# Altium footprint library 3D_MIG_Controller.PCBLIB: 560 footprints (part 23 of 35)
Each footprint in its own frame and in the unit in brackets; x right, y up, seen from the top. Pads: shape width x height; smd on the part's side, far side on the other; paste and mask are expansions set on the pad; w line width, h text height; cw(c..) or ccw(c..) is an arc to the next point about the centre after c.
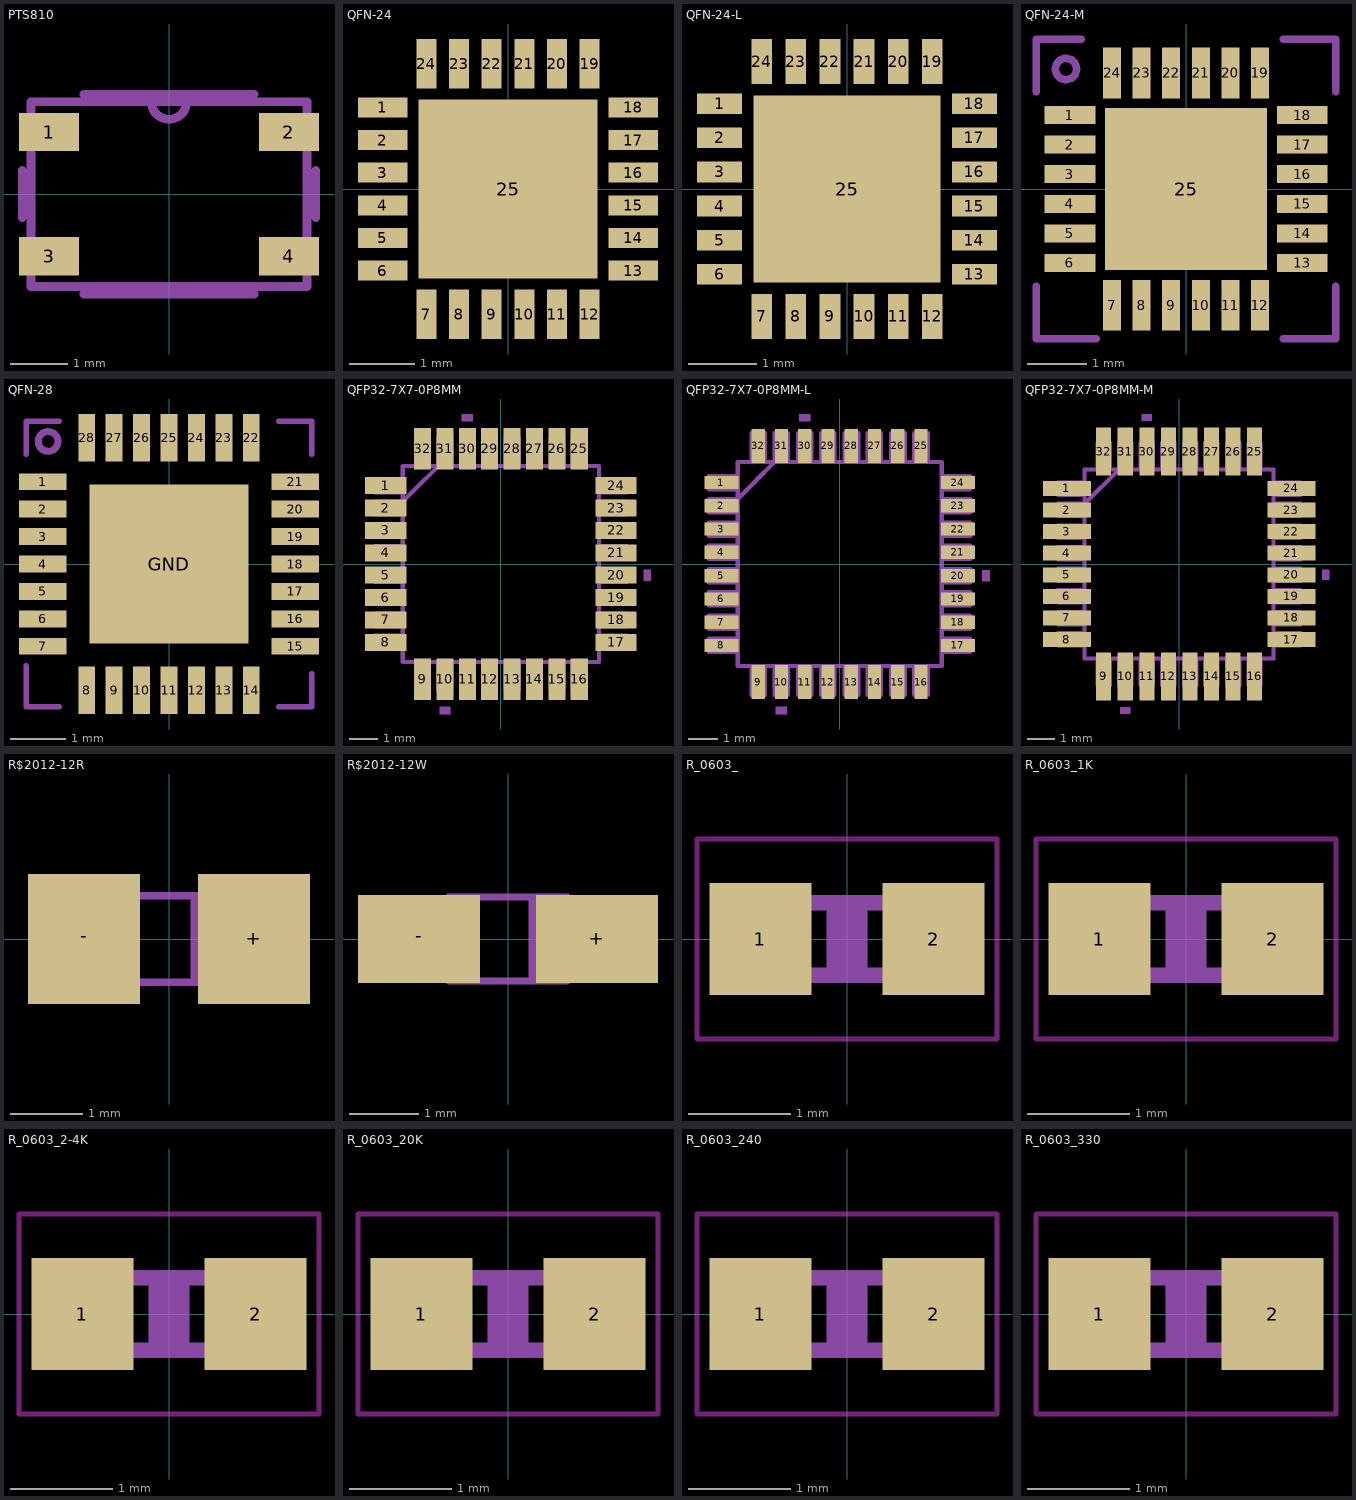
[diagram p22: the footprints below, top view; thin cyan lines are the x and y axes]

## PTS810 [mil]
pads (4):
  rect 41x26 smd: 1(-81.69,42.32) 2(81.69,42.32) 3(-81.69,-42.32) 4(81.69,-42.32)
tDocu:
  lines w6: -12,63 12,63 ; -12,63 -94,63 -94,-63 94,-63 94,63 12,63 ; -12,63 ccw(c0,63) 12,63
tPlace:
  lines w6: -100,-16 -100,16 ; -58,-68 58,-68 ; -58,68 58,68 ; 100,-16 100,16

## QFN-24 [mil]
pads (25):
  rect 30x12 smd: 1(-75.5,49.21) 2(-75.5,29.53) 3(-75.5,9.84) 4(-75.5,-9.84) 5(-75.5,-29.53) 6(-75.5,-49.21) 13(75.5,-49.21) 14(75.5,-29.53) 15(75.5,-9.84) 16(75.5,9.84) 17(75.5,29.53) 18(75.5,49.21)
  rect 12x30 smd: 7(-49.21,-75.5) 8(-29.53,-75.5) 9(-9.84,-75.5) 10(9.84,-75.5) 11(29.53,-75.5) 12(49.21,-75.5) 19(49.21,75.5) 20(29.53,75.5) 21(9.84,75.5) 22(-9.84,75.5) 23(-29.53,75.5) 24(-49.21,75.5)
  rect 108x108 smd paste+0: 25(0,0)

## QFN-24-L [mil]
pads (25):
  rect 26x12 smd: 1(-73.5,49.21) 2(-73.5,29.53) 3(-73.5,9.84) 4(-73.5,-9.84) 5(-73.5,-29.53) 6(-73.5,-49.21) 13(73.5,-49.21) 14(73.5,-29.53) 15(73.5,-9.84) 16(73.5,9.84) 17(73.5,29.53) 18(73.5,49.21)
  rect 12x26 smd: 7(-49.21,-73.5) 8(-29.53,-73.5) 9(-9.84,-73.5) 10(9.84,-73.5) 11(29.53,-73.5) 12(49.21,-73.5) 19(49.21,73.5) 20(29.53,73.5) 21(9.84,73.5) 22(-9.84,73.5) 23(-29.53,73.5) 24(-49.21,73.5)
  rect 108x108 smd paste+0: 25(0,0)

## QFN-24-M [mil]
pads (25):
  rect 34x12 smd: 1(-77.5,49.21) 2(-77.5,29.53) 3(-77.5,9.84) 4(-77.5,-9.84) 5(-77.5,-29.53) 6(-77.5,-49.21) 13(77.5,-49.21) 14(77.5,-29.53) 15(77.5,-9.84) 16(77.5,9.84) 17(77.5,29.53) 18(77.5,49.21)
  rect 12x34 smd: 7(-49.21,-77.5) 8(-29.53,-77.5) 9(-9.84,-77.5) 10(9.84,-77.5) 11(29.53,-77.5) 12(49.21,-77.5) 19(49.21,77.5) 20(29.53,77.5) 21(9.84,77.5) 22(-9.84,77.5) 23(-29.53,77.5) 24(-49.21,77.5)
  rect 108x108 smd paste+0: 25(0,0)
tPlace:
  circle w5: c-80,80 r7.07
  lines w5: -100,-65 -100,-100 -60,-100 ; -100,65 -100,100 -70,100 ; 65,-100 100,-100 100,-65 ; 65,100 100,100 100,65

## QFN-28 [mil]
pads (29):
  rect 34x12 smd: 1(-90.55,59.06) 2(-90.55,39.37) 3(-90.55,19.69) 4(-90.55,0) 5(-90.55,-19.69) 6(-90.55,-39.37) 7(-90.55,-59.06) 15(90.55,-59.06) 16(90.55,-39.37) 17(90.55,-19.69) 18(90.55,0) 19(90.55,19.69) 20(90.55,39.37) 21(90.55,59.06)
  rect 12x34 smd: 8(-59.06,-90.55) 9(-39.37,-90.55) 10(-19.69,-90.55) 11(0,-90.55) 12(19.69,-90.55) 13(39.37,-90.55) 14(59.06,-90.55) 22(59.06,90.55) 23(39.37,90.55) 24(19.69,90.55) 25(0,90.55) 26(-19.69,90.55) 27(-39.37,90.55) 28(-59.06,90.55)
  rect 114.17x114.17 smd paste+0: GND(0,0)
tPlace:
  circle w5: c-86.69,87.87 r7.07
  lines w3.94: -102.36,-72.87 -102.36,-102.36 -78.74,-102.36 ; -102.36,78.74 -102.36,102.36 -78.74,102.36 ; 78.74,-102.36 102.36,-102.36 102.36,-78.74 ; 78.74,102.36 102.36,102.36 102.36,78.74

## QFP32-7X7-0P8MM [mil]
pads (32):
  rect 58x24 smd: 1(-162,110.24) 2(-162,78.74) 3(-162,47.24) 4(-162,15.75) 5(-162,-15.75) 6(-162,-47.24) 7(-162,-78.74) 8(-162,-110.24) 17(162,-110.24) 18(162,-78.74) 19(162,-47.24) 20(162,-15.75) 21(162,15.75) 22(162,47.24) 23(162,78.74) 24(162,110.24)
  rect 24x58 smd: 9(-110.24,-162) 10(-78.74,-162) 11(-47.24,-162) 12(-15.75,-162) 13(15.75,-162) 14(47.24,-162) 15(78.74,-162) 16(110.24,-162) 25(110.24,162) 26(78.74,162) 27(47.24,162) 28(15.75,162) 29(-15.75,162) 30(-47.24,162) 31(-78.74,162) 32(-110.24,162)
tDocu:
  lines w6: -138,88 -138,70 -177,70 -177,88 -138,88 ; -138,88 -88,138 ; -88,138 -70,138 -70,177 -88,177 -88,138 ; -177,-119 -177,-101 -138,-101 -138,-119 -177,-119 ; -177,-88 -177,-70 -138,-70 -138,-88 -177,-88 ; -177,-56 -177,-38 -138,-38 -138,-56 -177,-56 ; -177,-25 -177,-7 -138,-7 -138,-25 -177,-25 ; -177,7 -177,25 -138,25 -138,7 -177,7 ; -177,38 -177,56 -138,56 -138,38 -177,38 ; -177,101 -177,119 -138,119 -138,101 -177,101 ; -138,-138 138,-138 138,138 -138,138 -138,-138 ; -119,-177 -119,-138 -101,-138 -101,-177 -119,-177 ; -119,138 -101,138 -101,177 -119,177 -119,138 ; -88,-177 -88,-138 -70,-138 -70,-177 -88,-177 ; -56,-177 -56,-138 -38,-138 -38,-177 -56,-177 ; -56,138 -38,138 -38,177 -56,177 -56,138 ; -25,-177 -25,-138 -7,-138 -7,-177 -25,-177 ; -25,138 -7,138 -7,177 -25,177 -25,138 ; 7,-177 7,-138 25,-138 25,-177 7,-177 ; 7,138 25,138 25,177 7,177 7,138 ; 38,-177 38,-138 56,-138 56,-177 38,-177 ; 38,138 56,138 56,177 38,177 38,138 ; 70,-177 70,-138 88,-138 88,-177 70,-177 ; 70,138 88,138 88,177 70,177 70,138 ; 101,-177 101,-138 119,-138 119,-177 101,-177 ; 101,138 119,138 119,177 101,177 101,138 ; 138,-119 138,-101 177,-101 177,-119 138,-119 ; 138,-88 138,-70 177,-70 177,-88 138,-88 ; 138,-56 138,-38 177,-38 177,-56 138,-56 ; 138,-25 138,-7 177,-7 177,-25 138,-25 ; 138,7 138,25 177,25 177,7 138,7 ; 138,38 138,56 177,56 177,38 138,38 ; 138,70 138,88 177,88 177,70 138,70 ; 138,101 138,119 177,119 177,101 138,101
  text "*" at -239,116 h62
tPlace:
  region: -86.24,-201 -86.24,-211 -71.24,-211 -71.24,-201
  region: 211,-8.25 211,-23.25 201,-23.25 201,-8.25
  region: -54.74,201 -54.74,211 -39.74,211 -39.74,201
  lines w6: -120,106 -106,120
  text "*" at -239,116 h62

## QFP32-7X7-0P8MM-L [mil]
pads (32):
  rect 46x18 smd: 1(-160,110.24) 2(-160,78.74) 3(-160,47.24) 4(-160,15.75) 5(-160,-15.75) 6(-160,-47.24) 7(-160,-78.74) 8(-160,-110.24) 17(160,-110.24) 18(160,-78.74) 19(160,-47.24) 20(160,-15.75) 21(160,15.75) 22(160,47.24) 23(160,78.74) 24(160,110.24)
  rect 18x46 smd: 9(-110.24,-160) 10(-78.74,-160) 11(-47.24,-160) 12(-15.75,-160) 13(15.75,-160) 14(47.24,-160) 15(78.74,-160) 16(110.24,-160) 25(110.24,160) 26(78.74,160) 27(47.24,160) 28(15.75,160) 29(-15.75,160) 30(-47.24,160) 31(-78.74,160) 32(-110.24,160)
tDocu:
  lines w6: -138,88 -138,70 -177,70 -177,88 -138,88 ; -138,88 -88,138 ; -88,138 -70,138 -70,177 -88,177 -88,138 ; -177,-119 -177,-101 -138,-101 -138,-119 -177,-119 ; -177,-88 -177,-70 -138,-70 -138,-88 -177,-88 ; -177,-56 -177,-38 -138,-38 -138,-56 -177,-56 ; -177,-25 -177,-7 -138,-7 -138,-25 -177,-25 ; -177,7 -177,25 -138,25 -138,7 -177,7 ; -177,38 -177,56 -138,56 -138,38 -177,38 ; -177,101 -177,119 -138,119 -138,101 -177,101 ; -138,-138 138,-138 138,138 -138,138 -138,-138 ; -119,-177 -119,-138 -101,-138 -101,-177 -119,-177 ; -119,138 -101,138 -101,177 -119,177 -119,138 ; -88,-177 -88,-138 -70,-138 -70,-177 -88,-177 ; -56,-177 -56,-138 -38,-138 -38,-177 -56,-177 ; -56,138 -38,138 -38,177 -56,177 -56,138 ; -25,-177 -25,-138 -7,-138 -7,-177 -25,-177 ; -25,138 -7,138 -7,177 -25,177 -25,138 ; 7,-177 7,-138 25,-138 25,-177 7,-177 ; 7,138 25,138 25,177 7,177 7,138 ; 38,-177 38,-138 56,-138 56,-177 38,-177 ; 38,138 56,138 56,177 38,177 38,138 ; 70,-177 70,-138 88,-138 88,-177 70,-177 ; 70,138 88,138 88,177 70,177 70,138 ; 101,-177 101,-138 119,-138 119,-177 101,-177 ; 101,138 119,138 119,177 101,177 101,138 ; 138,-119 138,-101 177,-101 177,-119 138,-119 ; 138,-88 138,-70 177,-70 177,-88 138,-88 ; 138,-56 138,-38 177,-38 177,-56 138,-56 ; 138,-25 138,-7 177,-7 177,-25 138,-25 ; 138,7 138,25 177,25 177,7 138,7 ; 138,38 138,56 177,56 177,38 138,38 ; 138,70 138,88 177,88 177,70 138,70 ; 138,101 138,119 177,119 177,101 138,101
  text "*" at -231,116 h62
tPlace:
  region: -86.24,-193 -86.24,-203 -71.24,-203 -71.24,-193
  region: 203,-8.25 203,-23.25 193,-23.25 193,-8.25
  region: -54.74,193 -54.74,203 -39.74,203 -39.74,193
  lines w6: -124,102 -102,124
  text "*" at -231,116 h62

## QFP32-7X7-0P8MM-M [mil]
pads (32):
  rect 70x22 smd: 1(-164,110.24) 2(-164,78.74) 3(-164,47.24) 4(-164,15.75) 5(-164,-15.75) 6(-164,-47.24) 7(-164,-78.74) 8(-164,-110.24) 17(164,-110.24) 18(164,-78.74) 19(164,-47.24) 20(164,-15.75) 21(164,15.75) 22(164,47.24) 23(164,78.74) 24(164,110.24)
  rect 22x70 smd: 9(-110.24,-164) 10(-78.74,-164) 11(-47.24,-164) 12(-15.75,-164) 13(15.75,-164) 14(47.24,-164) 15(78.74,-164) 16(110.24,-164) 25(110.24,164) 26(78.74,164) 27(47.24,164) 28(15.75,164) 29(-15.75,164) 30(-47.24,164) 31(-78.74,164) 32(-110.24,164)
tDocu:
  lines w6: -138,88 -138,70 -177,70 -177,88 -138,88 ; -138,88 -88,138 ; -88,138 -70,138 -70,177 -88,177 -88,138 ; -177,-119 -177,-101 -138,-101 -138,-119 -177,-119 ; -177,-88 -177,-70 -138,-70 -138,-88 -177,-88 ; -177,-56 -177,-38 -138,-38 -138,-56 -177,-56 ; -177,-25 -177,-7 -138,-7 -138,-25 -177,-25 ; -177,7 -177,25 -138,25 -138,7 -177,7 ; -177,38 -177,56 -138,56 -138,38 -177,38 ; -177,101 -177,119 -138,119 -138,101 -177,101 ; -138,-138 138,-138 138,138 -138,138 -138,-138 ; -119,-177 -119,-138 -101,-138 -101,-177 -119,-177 ; -119,138 -101,138 -101,177 -119,177 -119,138 ; -88,-177 -88,-138 -70,-138 -70,-177 -88,-177 ; -56,-177 -56,-138 -38,-138 -38,-177 -56,-177 ; -56,138 -38,138 -38,177 -56,177 -56,138 ; -25,-177 -25,-138 -7,-138 -7,-177 -25,-177 ; -25,138 -7,138 -7,177 -25,177 -25,138 ; 7,-177 7,-138 25,-138 25,-177 7,-177 ; 7,138 25,138 25,177 7,177 7,138 ; 38,-177 38,-138 56,-138 56,-177 38,-177 ; 38,138 56,138 56,177 38,177 38,138 ; 70,-177 70,-138 88,-138 88,-177 70,-177 ; 70,138 88,138 88,177 70,177 70,138 ; 101,-177 101,-138 119,-138 119,-177 101,-177 ; 101,138 119,138 119,177 101,177 101,138 ; 138,-119 138,-101 177,-101 177,-119 138,-119 ; 138,-88 138,-70 177,-70 177,-88 138,-88 ; 138,-56 138,-38 177,-38 177,-56 138,-56 ; 138,-25 138,-7 177,-7 177,-25 138,-25 ; 138,7 138,25 177,25 177,7 138,7 ; 138,38 138,56 177,56 177,38 138,38 ; 138,70 138,88 177,88 177,70 138,70 ; 138,101 138,119 177,119 177,101 138,101
  text "*" at -247,116 h62
tPlace:
  region: -86.24,-209 -86.24,-219 -71.24,-219 -71.24,-209
  region: 219,-8.25 219,-23.25 209,-23.25 209,-8.25
  region: -54.74,209 -54.74,219 -39.74,219 -39.74,209
  text "*" at -247,116 h62

## R$2012-12R [mm]
pads (2):
  rect 1.55x1.8 smd: +(1.175,0) -(-1.175,0)
tDocu:
  region: -1,-0.45 -1,0.45 -0.875,0.45 -0.875,-0.45
  region: 0.875,-0.45 0.875,0.45 1,0.45 1,-0.45
  region: 0.3,-0.625 0.3,0.625 0.5,0.625 0.5,-0.625
  lines w0.102: -0.85,-0.6 0.85,-0.6 0.85,0.6 -0.85,0.6 -0.85,-0.6

## R$2012-12W [mil]
pads (2):
  rect 68.9x49.61 smd: +(50.2,0) -(-50.2,0)
tDocu:
  region: -39.37,-17.72 -39.37,17.72 -34.45,17.72 -34.45,-17.72
  region: 34.45,-17.72 34.45,17.72 39.37,17.72 39.37,-17.72
  region: 11.81,-24.61 11.81,24.61 19.69,24.61 19.69,-24.61
  lines w4: -33.46,-23.62 33.46,-23.62 33.46,23.62 -33.46,23.62 -33.46,-23.62

## R_0603_ [mm]
pads (2):
  rect 1x1.1 smd: 1(-0.85,0) 2(0.85,0)
Top keep-out:
  lines w0.051: -1.473,-0.983 1.473,-0.983 1.473,0.983 -1.473,0.983 -1.473,-0.983
tDocu:
  region: 0.432,-0.432 0.432,0.432 0.838,0.432 0.838,-0.432
  region: -0.838,-0.432 -0.838,0.432 -0.432,0.432 -0.432,-0.432
  lines w0.152: -0.432,-0.356 0.432,-0.356 ; -0.432,0.356 0.432,0.356
tGlue:
  region: -0.2,-0.4 -0.2,0.4 0.2,0.4 0.2,-0.4

## R_0603_1K [mm]
pads (2):
  rect 1x1.1 smd: 1(-0.85,0) 2(0.85,0)
Top keep-out:
  lines w0.051: -1.473,-0.983 1.473,-0.983 1.473,0.983 -1.473,0.983 -1.473,-0.983
tDocu:
  region: 0.432,-0.432 0.432,0.432 0.838,0.432 0.838,-0.432
  region: -0.838,-0.432 -0.838,0.432 -0.432,0.432 -0.432,-0.432
  lines w0.152: -0.432,-0.356 0.432,-0.356 ; -0.432,0.356 0.432,0.356
tValues:
  text ">1K" at -0.635,-1.905 h0.59
tGlue:
  region: -0.2,-0.4 -0.2,0.4 0.2,0.4 0.2,-0.4

## R_0603_2-4K [mm]
pads (2):
  rect 1x1.1 smd: 1(-0.85,0) 2(0.85,0)
Top keep-out:
  lines w0.051: -1.473,-0.983 1.473,-0.983 1.473,0.983 -1.473,0.983 -1.473,-0.983
tDocu:
  region: 0.432,-0.432 0.432,0.432 0.838,0.432 0.838,-0.432
  region: -0.838,-0.432 -0.838,0.432 -0.432,0.432 -0.432,-0.432
  lines w0.152: -0.432,-0.356 0.432,-0.356 ; -0.432,0.356 0.432,0.356
tValues:
  text ">2.4K" at -0.635,-1.905 h0.59
tGlue:
  region: -0.2,-0.4 -0.2,0.4 0.2,0.4 0.2,-0.4

## R_0603_20K [mm]
pads (2):
  rect 1x1.1 smd: 1(-0.85,0) 2(0.85,0)
Top keep-out:
  lines w0.051: -1.473,-0.983 1.473,-0.983 1.473,0.983 -1.473,0.983 -1.473,-0.983
tDocu:
  region: 0.432,-0.432 0.432,0.432 0.838,0.432 0.838,-0.432
  region: -0.838,-0.432 -0.838,0.432 -0.432,0.432 -0.432,-0.432
  lines w0.152: -0.432,-0.356 0.432,-0.356 ; -0.432,0.356 0.432,0.356
tValues:
  text ">20K" at -0.635,-1.905 h0.59
tGlue:
  region: -0.2,-0.4 -0.2,0.4 0.2,0.4 0.2,-0.4

## R_0603_240 [mm]
pads (2):
  rect 1x1.1 smd: 1(-0.85,0) 2(0.85,0)
Top keep-out:
  lines w0.051: -1.473,-0.983 1.473,-0.983 1.473,0.983 -1.473,0.983 -1.473,-0.983
tDocu:
  region: 0.432,-0.432 0.432,0.432 0.838,0.432 0.838,-0.432
  region: -0.838,-0.432 -0.838,0.432 -0.432,0.432 -0.432,-0.432
  lines w0.152: -0.432,-0.356 0.432,-0.356 ; -0.432,0.356 0.432,0.356
tValues:
  text ">240" at -0.635,-1.905 h0.59
tGlue:
  region: -0.2,-0.4 -0.2,0.4 0.2,0.4 0.2,-0.4

## R_0603_330 [mm]
pads (2):
  rect 1x1.1 smd: 1(-0.85,0) 2(0.85,0)
Top keep-out:
  lines w0.051: -1.473,-0.983 1.473,-0.983 1.473,0.983 -1.473,0.983 -1.473,-0.983
tDocu:
  region: 0.432,-0.432 0.432,0.432 0.838,0.432 0.838,-0.432
  region: -0.838,-0.432 -0.838,0.432 -0.432,0.432 -0.432,-0.432
  lines w0.152: -0.432,-0.356 0.432,-0.356 ; -0.432,0.356 0.432,0.356
tValues:
  text ">330" at -0.635,-1.905 h0.59
tGlue:
  region: -0.2,-0.4 -0.2,0.4 0.2,0.4 0.2,-0.4